# Altium footprint library MOLEX THD.PcbLib: 71 footprints (part 3 of 5) (continued)
## MOLEX_43045-1200 [mm] "3.00mm (.118\") Pitch Micro-Fit 3.0™, Dual Row Righ Angled Header, with PCB Polarizing Peg, 12 Circuits"
height 8.77
pads (14):
  round 1.7 hole 1: 1(7.5,-1.5) 2(4.5,-1.5) 3(1.5,-1.5) 4(-1.5,-1.5) 5(-4.5,-1.5) 6(-7.5,-1.5) 7(7.5,1.5) 8(4.5,1.5) 9(1.5,1.5) 10(-1.5,1.5) 11(-4.5,1.5) 12(-7.5,1.5)
  round 0.5 hole 3 unplated mask+1.25: MECH1(-5.35,-5.82) MECH2(5.35,-5.82)
Top Overlay:
  lines w0.2: -9.325,-0.51 -9.325,-2.26 -8.555,-2.26 ; -8.343,-0.51 -11.075,-0.51 -11.075,-2.11 -10.825,-2.11 -10.825,-9.02 -9.425,-10.42 9.425,-10.42 10.825,-9.02 10.825,-2.11 11.075,-2.11 11.075,-0.51 8.343,-0.51 ; -6.657,-0.51 -5.343,-0.51 ; -6.445,-2.26 -5.555,-2.26 ; -3.657,-0.51 -2.343,-0.51 ; -3.445,-2.26 -2.555,-2.26 ; -0.75,-8.67 0.75,-8.67 ; -0.75,-7.92 0.75,-7.92 ; -0.657,-0.51 0.657,-0.51 ; -0.445,-2.26 0.445,-2.26 ; 2.343,-0.51 3.657,-0.51 ; 2.555,-2.26 3.445,-2.26 ; 5.343,-0.51 6.657,-0.51 ; 5.555,-2.26 6.445,-2.26 ; 8.555,-2.26 9.325,-2.26 9.325,-0.51 ; -0.75,-10.07 0.75,-10.07 0.75,-7.42 -0.75,-7.42 -0.75,-10.07
  text "1" at 7.292,-3.828 h1
  text "7" at 8.942,1.022 h1
  text "12" at -10.358,1.022 h1
  text "6" at -7.708,-3.828 h1
Mechanical 8:
  circle w0.1: c-5.35,-5.82 r1.5
  circle w0.1: c5.35,-5.82 r1.5
  lines w0.1: -8,-1.5 -7.5,-1.5 ; -8,1.5 -7.5,1.5 ; -7.5,-2 -7.5,-1.5 ; -7.5,-1 -7.5,-1.5 ; -7.5,1 -7.5,1.5 ; -7.5,2 -7.5,1.5 ; -7,-1.5 -7.5,-1.5 ; -7,1.5 -7.5,1.5 ; -5.85,-5.82 -5.35,-5.82 ; -5.35,-6.32 -5.35,-5.82 ; -5.35,-5.32 -5.35,-5.82 ; -5,-1.5 -4.5,-1.5 ; -5,1.5 -4.5,1.5 ; -4.85,-5.82 -5.35,-5.82 ; -4.5,-2 -4.5,-1.5 ; -4.5,-1 -4.5,-1.5 ; -4.5,1 -4.5,1.5 ; -4.5,2 -4.5,1.5 ; -4,-1.5 -4.5,-1.5 ; -4,1.5 -4.5,1.5 ; -2,-1.5 -1.5,-1.5 ; -2,1.5 -1.5,1.5 ; -1.5,-2 -1.5,-1.5 ; -1.5,-1 -1.5,-1.5 ; -1.5,1 -1.5,1.5 ; -1.5,2 -1.5,1.5 ; -1,-1.5 -1.5,-1.5 ; -1,1.5 -1.5,1.5 ; -0.5,0 0,0 ; 0,-0.5 0,0 ; 0,0.5 0,0 ; 0.5,0 0,0 ; 1,-1.5 1.5,-1.5 ; 1,1.5 1.5,1.5 ; 1.5,-2 1.5,-1.5 ; 1.5,-1 1.5,-1.5 ; 1.5,1 1.5,1.5 ; 1.5,2 1.5,1.5 ; 2,-1.5 1.5,-1.5 ; 2,1.5 1.5,1.5 ; 4,-1.5 4.5,-1.5 ; 4,1.5 4.5,1.5 ; 4.5,-2 4.5,-1.5 ; 4.5,-1 4.5,-1.5 ; 4.5,1 4.5,1.5 ; 4.5,2 4.5,1.5 ; 4.85,-5.82 5.35,-5.82 ; 5,-1.5 4.5,-1.5 ; 5,1.5 4.5,1.5 ; 5.35,-6.32 5.35,-5.82 ; 5.35,-5.32 5.35,-5.82 ; 5.85,-5.82 5.35,-5.82 ; 7,-1.5 7.5,-1.5 ; 7,1.5 7.5,1.5 ; 7.5,-2 7.5,-1.5 ; 7.5,-1 7.5,-1.5 ; 7.5,1 7.5,1.5 ; 7.5,2 7.5,1.5 ; 8,-1.5 7.5,-1.5 ; 8,1.5 7.5,1.5
Mechanical 14:
  lines w0.1: -9.325,-0.51 -9.325,-2.26 9.325,-2.26 9.325,-0.51 ; -7.82,-0.51 -11.075,-0.51 -11.075,-2.11 -10.825,-2.11 -10.825,-9.02 -9.425,-10.42 9.425,-10.42 10.825,-9.02 10.825,-2.11 11.075,-2.11 11.075,-0.51 7.82,-0.51 ; -7.18,-0.51 -4.82,-0.51 ; -4.18,-0.51 -1.82,-0.51 ; -1.18,-0.51 1.18,-0.51 ; -0.75,-8.67 0.75,-8.67 ; -0.75,-7.92 0.75,-7.92 ; 1.82,-0.51 4.18,-0.51 ; 4.82,-0.51 7.18,-0.51 ; -7.82,-1.82 -7.82,1.82 -7.18,1.82 -7.18,-1.82 -7.82,-1.82 ; -4.82,-1.82 -4.82,1.82 -4.18,1.82 -4.18,-1.82 -4.82,-1.82 ; -1.82,-1.82 -1.82,1.82 -1.18,1.82 -1.18,-1.82 -1.82,-1.82 ; -0.75,-10.07 0.75,-10.07 0.75,-7.42 -0.75,-7.42 -0.75,-10.07 ; 1.18,-1.82 1.18,1.82 1.82,1.82 1.82,-1.82 1.18,-1.82 ; 4.18,-1.82 4.18,1.82 4.82,1.82 4.82,-1.82 4.18,-1.82 ; 7.18,-1.82 7.18,1.82 7.82,1.82 7.82,-1.82 7.18,-1.82
  text "1" at 7.292,-3.828 h1
  text "7" at 8.942,1.022 h1
  text "12" at -10.358,1.022 h1
  text "6" at -7.708,-3.828 h1
3D body "MOLEX_43045-1200.stp": height 8.77, standoff -3.18, extent -11.075,-10.42 11.075,1.82

## MOLEX_43045-2012 [mm] "3.00mm (.118\") Pitch Micro-Fit 3.0™ Header, Dual Row, Vertical, with PCB Polarizing Peg, 20 Circuits"
height 9.91
pads (22):
  round 1.8 hole 1.1: 1(13.5,-1.5) 2(10.5,-1.5) 3(7.5,-1.5) 4(4.5,-1.5) 5(1.5,-1.5) 6(-1.5,-1.5) 7(-4.5,-1.5) 8(-7.5,-1.5) 9(-10.5,-1.5) 10(-13.5,-1.5) 11(13.5,1.5) 12(10.5,1.5) 13(7.5,1.5) 14(4.5,1.5) 15(1.5,1.5) 16(-1.5,1.5) 17(-4.5,1.5) 18(-7.5,1.5) 19(-10.5,1.5) 20(-13.5,1.5)
  round 0.5 hole 1.1 unplated mask+0.3: P1(-16.5,2.44) P2(16.5,2.44)
Top Overlay:
  lines w0.2: -17.075,1.748 -17.075,-3.97 -15.875,-3.97 -15.875,-3.46 ; -17.075,3.132 -17.075,3.4 17.075,3.4 17.075,3.132 ; -16.825,-3.97 -16.825,1.601 ; -16.825,-2.96 -15.875,-3.46 ; -16.825,-2.53 -15.425,-2.53 -15.425,-1.405 -16.825,-1.405 ; -16.825,-0.875 -15.425,-0.875 ; -16.825,0.875 -15.425,0.875 ; -16.825,1.345 -15.425,1.345 ; -16.825,3.279 -16.825,3.4 ; -15.825,-0.875 -15.825,-0.4 -16.125,-0.4 -16.125,0.4 -15.825,0.4 -15.825,0.875 ; -15.6,2.47 -15.425,2.47 ; -15.425,-3.46 -15.425,3.4 ; -1.15,-3.46 -1.15,-3.97 -0.35,-3.97 -0.35,-3.46 ; -0.75,3.4 -0.75,4.8 0.75,4.8 0.75,3.4 ; 0.35,-3.46 0.35,-3.97 1.15,-3.97 1.15,-3.46 ; 15.425,-3.46 15.425,3.4 ; 15.425,-2.53 16.825,-2.53 ; 15.425,-1.405 16.825,-1.405 ; 15.425,-0.875 16.825,-0.875 ; 15.425,0.875 16.825,0.875 ; 15.425,1.345 16.825,1.345 ; 15.425,2.47 15.6,2.47 ; 15.825,-0.875 15.825,-0.4 16.125,-0.4 16.125,0.4 15.825,0.4 15.825,0.875 ; 16.825,-3.97 16.825,1.601 ; 16.825,-2.96 15.875,-3.46 ; 16.825,3.279 16.825,3.4 ; 17.075,1.748 17.075,-3.97 15.875,-3.97 15.875,-3.46 ; -15.875,-3.46 15.875,-3.46 ; -14.77,-2.1 -14.07,-2.8 -12.23,-2.8 -12.23,-0.26 -14.77,-0.26 -14.77,-2.1 ; -14.77,0.9 -14.07,0.2 -12.23,0.2 -12.23,2.74 -14.77,2.74 -14.77,0.9 ; -11.77,-2.1 -11.07,-2.8 -9.23,-2.8 -9.23,-0.26 -11.77,-0.26 -11.77,-2.1 ; -11.77,0.2 -9.93,0.2 -9.23,0.9 -9.23,2.74 -11.77,2.74 -11.77,0.2 ; -8.77,-2.1 -8.07,-2.8 -6.23,-2.8 -6.23,-0.26 -8.77,-0.26 -8.77,-2.1 ; -8.77,0.2 -6.93,0.2 -6.23,0.9 -6.23,2.74 -8.77,2.74 -8.77,0.2 ; -5.77,-2.8 -3.93,-2.8 -3.23,-2.1 -3.23,-0.26 -5.77,-0.26 -5.77,-2.8 ; -5.77,0.2 -3.93,0.2 -3.23,0.9 -3.23,2.74 -5.77,2.74 -5.77,0.2 ; -2.77,-2.8 -0.93,-2.8 -0.23,-2.1 -0.23,-0.26 -2.77,-0.26 -2.77,-2.8 ; -2.77,0.9 -2.07,0.2 -0.23,0.2 -0.23,2.74 -2.77,2.74 -2.77,0.9 ; 0.23,-2.1 0.93,-2.8 2.77,-2.8 2.77,-0.26 0.23,-0.26 0.23,-2.1 ; 0.23,0.9 0.93,0.2 2.77,0.2 2.77,2.74 0.23,2.74 0.23,0.9 ; 3.23,-2.1 3.93,-2.8 5.77,-2.8 5.77,-0.26 3.23,-0.26 3.23,-2.1 ; 3.23,0.2 5.07,0.2 5.77,0.9 5.77,2.74 3.23,2.74 3.23,0.2 ; 6.23,-2.8 8.07,-2.8 8.77,-2.1 8.77,-0.26 6.23,-0.26 6.23,-2.8 ; 6.23,0.2 8.07,0.2 8.77,0.9 8.77,2.74 6.23,2.74 6.23,0.2 ; 9.23,-2.1 9.93,-2.8 11.77,-2.8 11.77,-0.26 9.23,-0.26 9.23,-2.1 ; 9.23,0.9 9.93,0.2 11.77,0.2 11.77,2.74 9.23,2.74 9.23,0.9 ; 12.23,-2.8 14.77,-2.8 14.77,-0.26 12.23,-0.26 12.23,-2.8 ; 12.23,0.9 12.93,0.2 14.77,0.2 14.77,2.74 12.23,2.74 12.23,0.9
  text "20" at -14.231,3.81 h1
  text "1" at 13.342,-4.953 h1
  text "2" at 10.167,-4.953 h1
Mechanical 8:
  circle w0.05: c-13.5,1.5 r0.55
  circle w0.05: c16.5,2.44 r0.55
  circle w0.05: c16.5,2.44 r0.9
  circle w0.05: c-16.5,2.44 r0.55
  circle w0.05: c-16.5,2.44 r0.9
  circle w0.05: c-13.5,1.5 r0.9
  lines w0.05: -16.5,1.94 -16.5,2.44 -16,2.44 ; -14,1.5 -13.5,1.5 ; -13.5,-2 -13.5,-1.5 -13,-1.5 ; -13.5,1 -13.5,1.5 ; -13.5,2 -13.5,1.5 ; -13,1.5 -13.5,1.5 ; -10.5,-2 -10.5,-1.5 -10,-1.5 ; -10.5,1 -10.5,1.5 -10,1.5 ; -7.5,-2 -7.5,-1.5 -7,-1.5 ; -7.5,1 -7.5,1.5 -7,1.5 ; -4.5,-2 -4.5,-1.5 -4,-1.5 ; -4.5,1 -4.5,1.5 -4,1.5 ; -1.5,-2 -1.5,-1.5 -1,-1.5 ; -1.5,1 -1.5,1.5 -1,1.5 ; -0.5,0 0,0 ; 0,-0.5 0,0 ; 0,0.5 0,0 ; 0.5,0 0,0 ; 1.5,-2 1.5,-1.5 2,-1.5 ; 1.5,1 1.5,1.5 2,1.5 ; 4.5,-2 4.5,-1.5 5,-1.5 ; 4.5,1 4.5,1.5 5,1.5 ; 7.5,-2 7.5,-1.5 8,-1.5 ; 7.5,1 7.5,1.5 8,1.5 ; 10.5,-2 10.5,-1.5 11,-1.5 ; 10.5,1 10.5,1.5 11,1.5 ; 13.5,-2 13.5,-1.5 14,-1.5 ; 13.5,1 13.5,1.5 14,1.5 ; 16.5,1.94 16.5,2.44 17,2.44
Mechanical 14:
  lines w0.1: -16.825,-3.97 -16.825,3.4 ; -16.825,-2.96 -15.875,-3.46 ; -16.825,-2.53 -15.425,-2.53 -15.425,-1.405 -16.825,-1.405 ; -16.825,-0.875 -15.425,-0.875 ; -16.825,0.875 -15.425,0.875 ; -16.825,1.345 -15.425,1.345 ; -16.825,2.47 -15.425,2.47 ; -15.825,-0.875 -15.825,-0.4 -16.125,-0.4 -16.125,0.4 -15.825,0.4 -15.825,0.875 ; -15.425,-3.46 -15.425,3.4 ; -1.15,-3.46 -1.15,-3.97 -0.35,-3.97 -0.35,-3.46 ; -0.75,3.4 -0.75,4.8 0.75,4.8 0.75,3.4 ; 0.35,-3.46 0.35,-3.97 1.15,-3.97 1.15,-3.46 ; 15.425,-3.46 15.425,3.4 ; 15.425,-2.53 16.825,-2.53 ; 15.425,-1.405 16.825,-1.405 ; 15.425,-0.875 16.825,-0.875 ; 15.425,0.875 16.825,0.875 ; 15.425,1.345 16.825,1.345 ; 15.425,2.47 16.825,2.47 ; 15.825,-0.875 15.825,-0.4 16.125,-0.4 16.125,0.4 15.825,0.4 15.825,0.875 ; 16.825,-3.97 16.825,3.4 ; 16.825,-2.96 15.875,-3.46 ; -15.875,-3.46 15.875,-3.46 ; -15.875,-3.46 -15.875,-3.97 -17.075,-3.97 -17.075,3.4 17.075,3.4 17.075,-3.97 15.875,-3.97 15.875,-3.46 ; -14.77,-2.1 -14.07,-2.8 -12.23,-2.8 -12.23,-0.26 -14.77,-0.26 -14.77,-2.1 ; -14.77,0.9 -14.07,0.2 -12.23,0.2 -12.23,2.74 -14.77,2.74 -14.77,0.9 ; -11.77,-2.1 -11.07,-2.8 -9.23,-2.8 -9.23,-0.26 -11.77,-0.26 -11.77,-2.1 ; -11.77,0.2 -9.93,0.2 -9.23,0.9 -9.23,2.74 -11.77,2.74 -11.77,0.2 ; -8.77,-2.1 -8.07,-2.8 -6.23,-2.8 -6.23,-0.26 -8.77,-0.26 -8.77,-2.1 ; -8.77,0.2 -6.93,0.2 -6.23,0.9 -6.23,2.74 -8.77,2.74 -8.77,0.2 ; -5.77,-2.8 -3.93,-2.8 -3.23,-2.1 -3.23,-0.26 -5.77,-0.26 -5.77,-2.8 ; -5.77,0.2 -3.93,0.2 -3.23,0.9 -3.23,2.74 -5.77,2.74 -5.77,0.2 ; -2.77,-2.8 -0.93,-2.8 -0.23,-2.1 -0.23,-0.26 -2.77,-0.26 -2.77,-2.8 ; -2.77,0.9 -2.07,0.2 -0.23,0.2 -0.23,2.74 -2.77,2.74 -2.77,0.9 ; 0.23,-2.1 0.93,-2.8 2.77,-2.8 2.77,-0.26 0.23,-0.26 0.23,-2.1 ; 0.23,0.9 0.93,0.2 2.77,0.2 2.77,2.74 0.23,2.74 0.23,0.9 ; 3.23,-2.1 3.93,-2.8 5.77,-2.8 5.77,-0.26 3.23,-0.26 3.23,-2.1 ; 3.23,0.2 5.07,0.2 5.77,0.9 5.77,2.74 3.23,2.74 3.23,0.2 ; 6.23,-2.8 8.07,-2.8 8.77,-2.1 8.77,-0.26 6.23,-0.26 6.23,-2.8 ; 6.23,0.2 8.07,0.2 8.77,0.9 8.77,2.74 6.23,2.74 6.23,0.2 ; 9.23,-2.1 9.93,-2.8 11.77,-2.8 11.77,-0.26 9.23,-0.26 9.23,-2.1 ; 9.23,0.9 9.93,0.2 11.77,0.2 11.77,2.74 9.23,2.74 9.23,0.9 ; 12.23,-2.8 14.77,-2.8 14.77,-0.26 12.23,-0.26 12.23,-2.8 ; 12.23,0.9 12.93,0.2 14.77,0.2 14.77,2.74 12.23,2.74 12.23,0.9
  text "1" at 13.342,-4.953 h1
  text "20" at -14.231,3.81 h1
  text "2" at 10.167,-4.953 h1
3D body "MOLEX_43045-2012.stp": height 9.91, standoff -3.18, extent -17.075,-3.97 17.075,4.8

## MOLEX_43160-2104 [mm] "7.50mm Pitch  4 Circuits Sabre™ Vertical Header  (Glow Wire Compatible) with Board Lock"
height 14.86
pads (10):
  round 2.5 hole 1.8: 1(-11.24,-1.59) 1(-11.24,1.59) 2(-3.747,-1.59) 2(-3.747,1.59) 3(3.747,-1.59) 3(3.747,1.59) 4(11.24,-1.59) 4(11.24,1.59)
  round 3.7 hole 3: MECH1(-15.989,1.844) MECH2(15.989,1.844)
Top Overlay:
  lines w0.2: -18.021,0.879 -18.021,-3.569 -16.751,-5.22 16.777,-5.22 18.047,-3.95 18.047,0.933 ; -18.021,2.808 -18.021,6.312 18.047,6.312 18.047,2.755 ; -16.485,-5.22 -16.485,-3.95 -15.469,-3.95 -15.469,-5.22 ; -16.485,-0.351 -16.485,-1.308 -15.481,-1.308 -15.481,-0.348 ; -16.485,6.312 -16.485,4.28 -15.469,4.28 -15.469,6.312 ; -14.542,0.121 -14.542,-1.105 -12.891,-2.756 -12.407,-2.756 ; -14.542,3.567 -14.542,3.848 -7.938,3.848 -7.938,-1.105 -9.589,-2.756 -10.072,-2.756 ; -5.702,6.312 -5.437,8.166 5.462,8.166 5.728,6.312 ; -4.914,-2.756 -5.398,-2.756 -7.049,-1.105 -7.049,2.197 -5.398,3.848 -2.095,3.848 -0.445,2.197 -0.445,-1.105 -2.095,-2.756 -2.579,-2.756 ; 2.579,-2.756 2.095,-2.756 0.445,-1.105 0.445,2.197 2.095,3.848 5.398,3.848 7.049,2.197 7.049,-1.105 5.398,-2.756 4.914,-2.756 ; 10.072,-2.756 9.589,-2.756 7.938,-1.105 7.938,3.848 14.542,3.848 14.542,3.566 ; 12.407,-2.756 12.891,-2.756 14.542,-1.105 14.542,0.122 ; 15.494,-5.22 15.494,-3.95 16.51,-3.95 16.51,-5.22 ; 15.494,-0.351 15.494,-1.308 16.51,-1.308 16.51,-0.345 ; 15.494,6.312 15.494,4.28 16.51,4.28 16.51,6.312
  text "1" at -11.5,-4.7 h1.2
Mechanical 8:
  lines w0.1: -16.489,1.844 -15.989,1.844 ; -15.989,1.344 -15.989,1.844 ; -15.989,2.344 -15.989,1.844 ; -15.489,1.844 -15.989,1.844 ; -11.74,-1.59 -11.24,-1.59 ; -11.74,1.59 -11.24,1.59 ; -11.24,-2.09 -11.24,-1.59 ; -11.24,-1.09 -11.24,-1.59 ; -11.24,1.09 -11.24,1.59 ; -11.24,2.09 -11.24,1.59 ; -10.74,-1.59 -11.24,-1.59 ; -10.74,1.59 -11.24,1.59 ; -4.247,-1.59 -3.747,-1.59 ; -4.247,1.59 -3.747,1.59 ; -3.747,-2.09 -3.747,-1.59 ; -3.747,-1.09 -3.747,-1.59 ; -3.747,1.09 -3.747,1.59 ; -3.747,2.09 -3.747,1.59 ; -3.247,-1.59 -3.747,-1.59 ; -3.247,1.59 -3.747,1.59 ; -0.5,0 0,0 ; 0,-0.5 0,0 ; 0,0.5 0,0 ; 0.5,0 0,0 ; 3.247,-1.59 3.747,-1.59 ; 3.247,1.59 3.747,1.59 ; 3.747,-2.09 3.747,-1.59 ; 3.747,-1.09 3.747,-1.59 ; 3.747,1.09 3.747,1.59 ; 3.747,2.09 3.747,1.59 ; 4.247,-1.59 3.747,-1.59 ; 4.247,1.59 3.747,1.59 ; 10.74,-1.59 11.24,-1.59 ; 10.74,1.59 11.24,1.59 ; 11.24,-2.09 11.24,-1.59 ; 11.24,-1.09 11.24,-1.59 ; 11.24,1.09 11.24,1.59 ; 11.24,2.09 11.24,1.59 ; 11.74,-1.59 11.24,-1.59 ; 11.74,1.59 11.24,1.59 ; 15.489,1.844 15.989,1.844 ; 15.989,1.344 15.989,1.844 ; 15.989,2.344 15.989,1.844 ; 16.489,1.844 15.989,1.844
Mechanical 14:
  lines w0.1: -16.485,-5.22 -16.485,-3.95 -15.469,-3.95 -15.469,-5.22 ; -16.485,6.312 -16.485,4.28 -15.469,4.28 -15.469,6.312 ; -5.702,6.312 -5.437,8.166 5.462,8.166 5.728,6.312 ; 15.494,-5.22 15.494,-3.95 16.51,-3.95 16.51,-5.22 ; 15.494,6.312 15.494,4.28 16.51,4.28 16.51,6.312 ; -18.021,-3.569 -18.021,6.312 18.047,6.312 18.047,-3.95 16.777,-5.22 -16.751,-5.22 -18.021,-3.569 ; -16.485,-1.308 -16.485,1.232 -15.481,1.232 -15.481,-1.308 -16.485,-1.308 ; -14.542,-1.105 -14.542,3.848 -7.938,3.848 -7.938,-1.105 -9.589,-2.756 -12.891,-2.756 -14.542,-1.105 ; -11.494,-1.041 -11.494,2.134 -10.986,2.134 -10.986,-1.041 -11.494,-1.041 ; -7.049,-1.105 -7.049,2.197 -5.398,3.848 -2.095,3.848 -0.445,2.197 -0.445,-1.105 -2.095,-2.756 -5.398,-2.756 -7.049,-1.105 ; -4.001,-1.041 -4.001,2.134 -3.493,2.134 -3.493,-1.041 -4.001,-1.041 ; 0.445,-1.105 0.445,2.197 2.095,3.848 5.398,3.848 7.049,2.197 7.049,-1.105 5.398,-2.756 2.095,-2.756 0.445,-1.105 ; 3.493,-1.041 3.493,2.134 4.001,2.134 4.001,-1.041 3.493,-1.041 ; 7.938,-1.105 7.938,3.848 14.542,3.848 14.542,-1.105 12.891,-2.756 9.589,-2.756 7.938,-1.105 ; 10.986,-1.041 10.986,2.134 11.494,2.134 11.494,-1.041 10.986,-1.041 ; 15.494,-1.308 15.494,1.232 16.51,1.232 16.51,-1.308 15.494,-1.308
  text "1" at -11.5,-4.7 h1.2
3D body "MOLEX_43160-2104.stp": height 14.76, standoff -3.81, extent -18.021,-5.22 18.047,8.166

## MOLEX_43879-0022 [mm] "4.20mm Pitch, Mini-Fit® CPI (Compliant Pin Interface) 4 Circuits Dual Row Vertical Header"
height 14.9
pads (4):
  round 2.5 hole 1.8: 1(-2.1,1.9) 2(2.1,1.9) 3(-2.1,-2.314) 4(2.1,-2.314)
Top Overlay:
  lines w0.2: -9.405,-1.8 -8.525,-1.8 ; -9.405,-1.3 -8.525,-1.3 ; -9.405,1.25 -7.5,1.25 ; -9.405,2.75 -7.5,2.75 ; -8.833,4.5 -8.6,4.001 ; -8.525,1.25 -8.525,2.75 ; -8.075,-1.8 -6.755,-1.8 -6.755,-1.3 ; -8.075,-1.3 -4.3,-1.3 ; -8.075,1.25 -8.075,2.75 ; -7.767,4.5 -8,4.001 ; -7.5,-4.3 -7.5,-7.5 -3,-7.5 -3,-4 ; -7.5,-1.3 -7.5,7.5 7.5,7.5 7.5,-1.3 ; -7.5,4.5 -9.405,4.5 -9.405,-4.3 -3,-4.3 ; -6.86,-4.3 -6.86,-1.8 ; -6.6,-4.3 -6.6,-6.6 ; -6.6,-1.3 -6.6,6.6 ; -3,-6.6 -6.6,-6.6 ; -3,-6.55 -2,-6.55 -2,-4 ; -3,-5.35 -2,-5.35 ; -2.845,0.4 -4,0.4 -4,4 -0.2,4 -0.2,0.4 -1.355,0.4 ; -2,-6.4 2,-6.4 ; 1.355,0.4 0.2,0.4 0.2,3.2 1,4 3.2,4 4,3.2 4,0.4 2.845,0.4 ; 2,-5.35 3,-5.35 ; 2,-3.986 2,-6.55 3,-6.55 ; 3,-6.6 6.6,-6.6 ; 3,-4.3 9.405,-4.3 9.405,4.5 7.5,4.5 ; 3,-4 3,-7.5 7.5,-7.5 7.5,-4.3 ; 4.3,-1.3 8.075,-1.3 ; 6.6,-4.3 6.6,-6.6 ; 6.6,-1.3 6.6,6.6 ; 6.86,-4.3 6.86,-1.8 ; 7.5,1.25 9.405,1.25 ; 7.5,2.75 9.405,2.75 ; 7.767,4.5 8,4.001 ; 8.075,1.25 8.075,2.75 ; 8.525,-1.3 9.405,-1.3 ; 8.525,1.25 8.525,2.75 ; 8.833,4.5 8.6,4 ; -8.6,4.001 -8,4.001 ; -8.6,4.001 -8.6,3.75 -8,3.75 -8,4.001 ; -6.6,-6.6 -4.3,-4.3 -4.3,4.3 ; -6.6,6.6 -4.3,4.3 ; -6.6,6.6 6.6,6.6 ; -4.3,4.3 4.3,4.3 ; 4.3,4.3 6.6,6.6 ; 4.3,4.3 4.3,-4.3 6.6,-6.6 ; 8,4.001 8.6,4 ; 8,4.001 8,3.75 8.6,3.75 8.6,4.001 ; -8.525,-2.3 -8.075,-2.3 -8.075,-0.8 -8.525,-0.8 -8.525,-2.3 ; -4,-4 -4,-1.2 -3.2,-0.4 -1,-0.4 -0.2,-1.2 -0.2,-4 -4,-4 ; 0.2,-4 4,-4 4,-0.4 0.2,-0.4 0.2,-4 ; 8.075,-2.3 8.525,-2.3 8.525,-0.8 8.075,-0.8 8.075,-2.3
  text "1" at -5.767,1.432 h1
  text "4" at 5.242,-2.975 h1
  text "2" at 5.192,1.386 h1
  text "3" at -5.733,-3.289 h1
Mechanical 8:
  lines w0.1: -2.6,-2.314 -2.1,-2.314 ; -2.6,1.9 -2.1,1.9 ; -2.1,-2.814 -2.1,-2.314 ; -2.1,-1.814 -2.1,-2.314 ; -2.1,1.4 -2.1,1.9 ; -2.1,2.4 -2.1,1.9 ; -1.6,-2.314 -2.1,-2.314 ; -1.6,1.9 -2.1,1.9 ; -0.5,0 0,0 ; 0,-0.5 0,0 ; 0,0.5 0,0 ; 0.5,0 0,0 ; 1.6,-2.314 2.1,-2.314 ; 1.6,1.9 2.1,1.9 ; 2.1,-2.814 2.1,-2.314 ; 2.1,-1.814 2.1,-2.314 ; 2.1,1.4 2.1,1.9 ; 2.1,2.4 2.1,1.9 ; 2.6,-2.314 2.1,-2.314 ; 2.6,1.9 2.1,1.9
Mechanical 14:
  lines w0.1: -9.405,-1.8 -8.525,-1.8 ; -9.405,-1.3 -8.525,-1.3 ; -9.405,1.25 -7.5,1.25 ; -9.405,2.75 -7.5,2.75 ; -8.833,4.5 -8.6,4.001 ; -8.525,1.25 -8.525,2.75 ; -8.075,-1.8 -6.755,-1.8 -6.755,-1.3 ; -8.075,-1.3 -4.3,-1.3 ; -8.075,1.25 -8.075,2.75 ; -7.767,4.5 -8,4.001 ; -7.5,-4.3 -7.5,-7.5 -3,-7.5 -3,-3.55 -2,-3.55 -2,-6.55 -3,-6.55 ; -7.5,-1.3 -7.5,7.5 7.5,7.5 7.5,-1.3 ; -7.5,4.5 -9.405,4.5 -9.405,-4.3 -3,-4.3 ; -6.86,-4.3 -6.86,-1.8 ; -6.6,-4.3 -6.6,-6.6 ; -6.6,-1.3 -6.6,6.6 ; -3,-6.6 -6.6,-6.6 ; -3,-5.35 -2,-5.35 ; -2,-6.4 2,-6.4 ; -0.7,-4 -0.7,-2.3 -0.2,-2.3 ; -0.7,-0.7 -0.7,-1.5 -0.2,-1.5 ; -0.7,0.4 -0.7,2.1 -0.2,2.1 ; 0.2,-3.96 0.7,-3.96 0.7,-2.3 0.2,-2.3 ; 0.2,-1.5 0.7,-1.5 0.7,-0.4 ; 0.2,2.1 0.7,2.1 0.7,0.4 ; 2,-5.35 3,-5.35 ; 3,-6.6 6.6,-6.6 ; 3,-6.55 2,-6.55 2,-3.55 3,-3.55 3,-7.5 7.5,-7.5 7.5,-4.3 ; 3,-4.3 9.405,-4.3 9.405,4.5 7.5,4.5 ; 4.3,-1.3 8.075,-1.3 ; 6.6,-4.3 6.6,-6.6 ; 6.6,-1.3 6.6,6.6 ; 6.86,-4.3 6.86,-1.8 ; 7.5,1.25 9.405,1.25 ; 7.5,2.75 9.405,2.75 ; 7.767,4.5 8,4.001 ; 8.075,1.25 8.075,2.75 ; 8.525,-1.3 9.405,-1.3 ; 8.525,1.25 8.525,2.75 ; 8.833,4.5 8.6,4 ; -8.6,4.001 -8,4.001 ; -8.6,4.001 -8.6,3.75 -8,3.75 -8,4.001 ; -6.6,-6.6 -4.3,-4.3 -4.3,4.3 ; -6.6,6.6 -4.3,4.3 ; -6.6,6.6 6.6,6.6 ; -4.3,4.3 4.3,4.3 ; 4.3,4.3 6.6,6.6 ; 4.3,4.3 4.3,-4.3 6.6,-6.6 ; 8,4.001 8.6,4 ; 8,4.001 8,3.75 8.6,3.75 8.6,4.001 ; -8.525,-2.3 -8.075,-2.3 -8.075,-0.8 -8.525,-0.8 -8.525,-2.3 ; -4,-4 -4,-1.2 -3.2,-0.4 -1,-0.4 -0.2,-1.2 -0.2,-4 -4,-4 ; -4,0.4 -0.2,0.4 -0.2,4 -4,4 -4,0.4 ; -2.475,-2.675 -1.725,-2.675 -1.725,-1.925 -2.475,-1.925 -2.475,-2.675 ; -2.475,1.525 -1.725,1.525 -1.725,2.275 -2.475,2.275 -2.475,1.525 ; 0.2,-4 4,-4 4,-0.4 0.2,-0.4 0.2,-4 ; 0.2,0.4 0.2,3.2 1,4 3.2,4 4,3.2 4,0.4 0.2,0.4 ; 1.725,-2.675 2.475,-2.675 2.475,-1.925 1.725,-1.925 1.725,-2.675 ; 1.725,1.525 2.475,1.525 2.475,2.275 1.725,2.275 1.725,1.525 ; 8.075,-2.3 8.525,-2.3 8.525,-0.8 8.075,-0.8 8.075,-2.3
  text "1" at -5.767,1.432 h1
  text "4" at 5.242,-2.975 h1
  text "2" at 5.192,1.386 h1
  text "3" at -5.733,-3.289 h1
Drill Drawing:
  lines w0.1: -4,-4 -4,4 4,4 4,-4 -4,-4
  text "PRESS-FIT TECHNOLOGY" at -8.275,6.075 h1
  text "diam. 1.8mm +0.1 -0.05" at -8.9,4.4 h1
3D body "MOLEX_43879-0022.stp": height 14.9, standoff -5.82, extent -9.405,-7.5 9.405,7.5

## MOLEX_48037-0001 [mm] "Right Angled Through Hole Shielded USB Plug, Type A"
height 4.6
pads (8):
  round 1.25 hole 0.7: 1(3.5,0) 2(1,0) 3(-1,0) 4(-3.5,0)
  round 1.8 hole 1.1: 5(-2.25,-2.1) 6(2.25,-2.1)
  oval 1.35x2.85 hole 1 slot 2.5 at 90 deg: SHIELD(-5.7,-2.1) SHIELD(5.7,-2.1)
Top Overlay:
  lines w0.2: -6,-4.063 -6,-19.727 -5.9,-19.9 5.9,-19.9 6,-19.727 6,-4.063 ; -5.1,-10.45 -4.3,-10.45 -4.3,-9.2 -5.1,-9.2 -5.1,-10.45 ; -4.1,-14.9 -1.9,-14.9 -1.9,-13.1 -4.1,-13.1 -4.1,-14.9 ; 1.9,-14.9 1.9,-13.1 4.1,-13.1 4.1,-14.9 1.9,-14.9 ; 4.3,-10.45 5.1,-10.45 5.1,-9.2 4.3,-9.2 4.3,-10.45
Mechanical 8:
  circle w0.1: c3.5,0 r0.45
  circle w0.1: c1,0 r0.45
  circle w0.1: c-1,0 r0.45
  circle w0.1: c-3.5,0 r0.45
  circle w0.1: c-2.25,-2.1 r0.55
  circle w0.1: c2.25,-2.1 r0.55
  circle w0.1: c-2.25,-2.1 r0.9
  circle w0.1: c2.25,-2.1 r0.9
  circle w0.1: c-3.5,0 r0.8
  circle w0.1: c-1,0 r0.8
  circle w0.1: c1,0 r0.8
  circle w0.1: c3.5,0 r0.8
  lines w0.1: -6.2,-2.1 -5.7,-2.1 ; -5.7,-4.85 0,-4.85 5.7,-4.85 ; -5.7,-2.6 -5.7,-2.1 ; -5.7,-1.6 -5.7,-2.1 ; -5.2,-2.1 -5.7,-2.1 ; -4,0 -3.5,0 ; -3.5,-0.5 -3.5,0 ; -3.5,0.5 -3.5,0 ; -3,0 -3.5,0 ; -2.75,-2.1 -2.25,-2.1 ; -2.25,-2.6 -2.25,-2.1 ; -2.25,-1.6 -2.25,-2.1 ; -1.75,-2.1 -2.25,-2.1 ; -1.5,0 -1,0 ; -1,-0.5 -1,0 ; -1,0.5 -1,0 ; -0.5,0 -1,0 ; -0.354,-0.354 0,0 ; -0.354,0.354 0,0 ; 0.354,-0.354 0,0 ; 0.354,0.354 0,0 ; 0.5,0 1,0 ; 1,-0.5 1,0 ; 1,0.5 1,0 ; 1.5,0 1,0 ; 1.75,-2.1 2.25,-2.1 ; 2.25,-2.6 2.25,-2.1 ; 2.25,-1.6 2.25,-2.1 ; 2.75,-2.1 2.25,-2.1 ; 3,0 3.5,0 ; 3.5,-0.5 3.5,0 ; 3.5,0.5 3.5,0 ; 4,0 3.5,0 ; 5.2,-2.1 5.7,-2.1 ; 5.7,-2.6 5.7,-2.1 ; 5.7,-1.6 5.7,-2.1 ; 6.2,-2.1 5.7,-2.1 ; -6.55,-2.85 ccw(c-5.7,-2.85) -4.85,-2.85 -4.85,-1.35 ccw(c-5.7,-1.35) -6.55,-1.35 -6.55,-2.85 ; -6.2,-2.85 ccw(c-5.7,-2.85) -5.2,-2.85 -5.2,-1.35 ccw(c-5.7,-1.35) -6.2,-1.35 -6.2,-2.85 ; 4.85,-2.85 ccw(c5.7,-2.85) 6.55,-2.85 6.55,-1.35 ccw(c5.7,-1.35) 4.85,-1.35 4.85,-2.85 ; 5.2,-2.85 ccw(c5.7,-2.85) 6.2,-2.85 6.2,-1.35 ccw(c5.7,-1.35) 5.2,-1.35 5.2,-2.85
Mechanical 14:
  lines w0.1: -6,-3.1 -6.349,-3.1 -6.349,-1.1 6.349,-1.1 6.349,-3.1 6,-3.1 ; -6,-1.1 -6,-19.727 -5.9,-19.9 5.9,-19.9 6,-19.727 6,-1.1 ; -3.8,-1.11 -3.8,0.125 -3.2,0.125 -3.2,-1.1 ; -1.3,-1.1 -1.3,0.125 -0.7,0.125 -0.7,-1.1 ; 0.7,-1.1 0.7,0.125 1.3,0.125 1.3,-1.1 ; 3.2,-1.1 3.2,0.125 3.8,0.125 3.8,-1.1 ; -5.1,-10.45 -4.3,-10.45 -4.3,-9.2 -5.1,-9.2 -5.1,-10.45 ; -4.1,-14.9 -1.9,-14.9 -1.9,-13.1 -4.1,-13.1 -4.1,-14.9 ; 1.9,-14.9 1.9,-13.1 4.1,-13.1 4.1,-14.9 1.9,-14.9 ; 4.3,-10.45 5.1,-10.45 5.1,-9.2 4.3,-9.2 4.3,-10.45
3D body "MOLEX_48037-0001.stp": height 3.07, standoff -2.81, extent -6.173,-19.9 6.173,0.125

## MOLEX_52030-0629 [mm] "6 Contacts, 1.0mm Pitch, Vertical Through-Hole FCC/FPC Connector"
height 6.7
pads (6):
  round 1.4 hole 0.7: 1(-2.5,-1) 2(-1.5,1) 3(-0.5,-1) 4(0.5,1) 5(1.5,-1) 6(2.5,1)
Top Overlay:
  circle w0.3: c-2.525,-2.35 r0.15
  lines w0.2: -3.8,1.75 -3.8,-0.2 ; -3.6,1.75 -3.6,0 ; -3.575,1.177 -2.725,1.177 ; -3.305,-1.75 -5.15,-1.75 -5.65,-1.25 -5.65,1.75 -2.305,1.75 ; -3.255,-0.2 -3.8,-0.2 ; -2.958,0 -3.6,0 ; -2.725,0.077 -2.725,0.9 ; -2.725,1.25 -2.571,1.25 ; -1.745,-0.2 -1.255,-0.2 ; -1.695,-1.75 -1.305,-1.75 ; -0.695,1.75 -0.305,1.75 ; 0.255,-0.2 0.745,-0.2 ; 0.305,-1.75 0.695,-1.75 ; 1.305,1.75 1.695,1.75 ; 2.255,-0.2 3.8,-0.2 ; 2.305,-1.75 5.15,-1.75 5.65,-1.25 5.65,1.75 3.305,1.75 ; 2.958,0 3.6,0 ; 3.525,1.4 3.575,1.4 3.575,1.233 ; 3.6,1.75 3.6,0 ; 3.8,1.75 3.8,-0.2 ; -3.8,-0.2 -3.6,0 ; -2.725,0.9 -2.725,1.4 -3.575,1.4 -3.575,0.9 -2.725,0.9 ; 3.6,0 3.8,-0.2
Mechanical 8:
  lines w0.1: -3,-1 -2.5,-1 ; -2.5,-1.5 -2.5,-1 ; -2.5,-0.5 -2.5,-1 ; -2,-1 -2.5,-1 ; -2,1 -1.5,1 ; -1.5,0.5 -1.5,1 ; -1.5,1.5 -1.5,1 ; -1,-1 -0.5,-1 ; -1,1 -1.5,1 ; -0.5,-1.5 -0.5,-1 ; -0.5,-0.5 -0.5,-1 ; -0.5,0 0,0 ; 0,-1 -0.5,-1 ; 0,-0.5 0,0 ; 0,0.5 0,0 ; 0,1 0.5,1 ; 0.5,0 0,0 ; 0.5,0.5 0.5,1 ; 0.5,1.5 0.5,1 ; 1,-1 1.5,-1 ; 1,1 0.5,1 ; 1.5,-1.5 1.5,-1 ; 1.5,-0.5 1.5,-1 ; 2,-1 1.5,-1 ; 2,1 2.5,1 ; 2.5,0.5 2.5,1 ; 2.5,1.5 2.5,1 ; 3,1 2.5,1
Mechanical 14:
  circle w0.3: c-2.525,-2.35 r0.15
  lines w0.1: -3.8,1.75 -3.8,-0.2 ; -3.6,1.75 -3.6,0 ; -3.575,1.177 -2.725,1.177 ; -2.725,0 -2.725,0.9 ; -2.725,1.25 -2.275,1.25 ; -2.275,0 -2.275,0.9 ; -2,1.4 -2,1.061 ; -1.725,0 -1.725,0.9 ; -1.725,1.061 -2,1.061 ; -1.725,1.25 -1.275,1.25 ; -1.275,0 -1.275,0.9 ; -1.275,1.061 -0.725,1.061 ; -0.725,0 -0.725,0.9 ; -0.725,1.25 -0.275,1.25 ; -0.275,0 -0.275,0.9 ; -0.275,1.061 0.275,1.061 ; 0.275,0 0.275,0.9 ; 0.275,1.25 0.725,1.25 ; 0.725,0 0.725,0.9 ; 0.725,1.061 1.275,1.061 ; 1.275,0 1.275,0.9 ; 1.275,1.25 1.725,1.25 ; 1.725,0 1.725,0.9 ; 1.725,1.061 2,1.061 ; 2,1.4 2,1.061 ; 2.275,0 2.275,0.9 ; 2.275,1.25 2.725,1.25 ; 2.725,0 2.725,0.9 ; 2.725,1.177 3.575,1.177 ; 3.6,1.75 3.6,0 ; 3.8,1.75 3.8,-0.2 ; -3.8,-0.2 -3.6,0 ; -3.8,-0.2 3.8,-0.2 ; -3.6,0 3.6,0 ; -2.725,0.9 -2.725,1.4 -3.575,1.4 -3.575,0.9 -2.725,0.9 ; -2.275,0.9 -2,1.061 ; -2.275,0.9 -2.275,1.4 -1.725,1.4 -1.725,0.9 ; -2.275,0.9 -1.725,0.9 ; -1.275,0.9 -1.275,1.4 -0.725,1.4 -0.725,0.9 ; -1.275,0.9 -0.725,0.9 ; -0.275,0.9 -0.275,1.4 0.275,1.4 0.275,0.9 ; -0.275,0.9 0.275,0.9 ; 0.725,0.9 0.725,1.4 1.275,1.4 1.275,0.9 ; 0.725,0.9 1.275,0.9 ; 1.725,0.9 1.725,1.4 2.275,1.4 2.275,0.9 ; 1.725,0.9 2.275,0.9 ; 2,1.061 2.275,0.9 ; 2.725,0.9 2.725,1.4 3.575,1.4 3.575,0.9 2.725,0.9 ; 3.6,0 3.8,-0.2 ; -5.65,-1.25 -5.15,-1.75 5.15,-1.75 5.65,-1.25 5.65,1.75 -5.65,1.75 -5.65,-1.25
3D body "MOLEX_52030-0629.stp": height 6.7, standoff -3.2, extent -5.65,-1.75 5.65,1.75

## MOLEX_53047-0210 [mm] "1.25mm Pitch PicoBlade™ Wire-to-Board 2 Circuits Vertical Header with Friction Lock"
height 4.2
pads (2):
  rrect50% 1.05x1.25 hole 0.55: 1(-0.625,0) 2(0.625,0)
Top Overlay:
  circle w0.3: c-0.625,-1.825 r0.15
  lines w0.2: -2.125,1.675 2.125,1.675 ; -1.825,0.05 -1.525,0.05 -1.525,-0.725 ; -1.825,0.9 -1.525,0.9 -1.525,1.975 1.525,1.975 1.525,0.9 1.825,0.9 ; -1.825,1.675 -1.825,-1.025 ; -1.325,-0.725 -1.525,-0.725 ; -1.325,1.675 -1.325,2.075 ; 1.325,-0.725 1.525,-0.725 ; 1.325,1.675 1.325,2.075 ; 1.825,0.05 1.525,0.05 1.525,-0.725 ; 1.825,1.675 1.825,-1.025 ; -1.825,-1.025 1.825,-1.025 ; -1.825,-1.025 -1.525,-0.725 ; 1.525,-0.725 1.825,-1.025 ; -2.125,-1.125 2.125,-1.125 2.125,2.075 -2.125,2.075 -2.125,-1.125
Mechanical 8:
  lines w0.1: -1.125,0 -0.625,0 ; -0.625,-0.5 -0.625,0 ; -0.625,0.5 -0.625,0 ; -0.354,-0.354 0,0 ; -0.354,0.354 0,0 ; -0.125,0 -0.625,0 ; 0.125,0 0.625,0 ; 0.354,-0.354 0,0 ; 0.354,0.354 0,0 ; 0.625,-0.5 0.625,0 ; 0.625,0.5 0.625,0 ; 1.125,0 0.625,0
Mechanical 14:
  circle w0.3: c-0.625,-1.825 r0.15
  lines w0.1: -2.125,1.675 2.125,1.675 ; -1.825,0.05 -1.525,0.05 -1.525,-0.725 ; -1.825,0.9 -1.525,0.9 -1.525,1.975 1.525,1.975 1.525,0.9 1.825,0.9 ; -1.825,1.675 -1.825,-1.025 ; -1.325,1.675 -1.325,2.075 ; 1.325,1.675 1.325,2.075 ; 1.825,0.05 1.525,0.05 1.525,-0.725 ; 1.825,1.675 1.825,-1.025 ; -1.825,-1.025 1.825,-1.025 ; -1.825,-1.025 -1.525,-0.725 ; -1.525,-0.725 1.525,-0.725 ; -0.785,-0.35 -0.65,-0.225 ; -0.785,-0.35 -0.785,0.35 ; -0.785,-0.35 -0.465,-0.35 ; -0.785,0.35 -0.65,0.225 ; -0.785,0.35 -0.465,0.35 ; -0.65,-0.225 -0.65,0.225 ; -0.65,-0.225 -0.6,-0.225 ; -0.65,0.225 -0.6,0.225 ; -0.6,-0.225 -0.6,0.225 ; -0.6,-0.225 -0.465,-0.35 ; -0.6,0.225 -0.465,0.35 ; -0.465,-0.35 -0.465,0.35 ; 0.465,-0.35 0.6,-0.225 ; 0.465,-0.35 0.465,0.35 ; 0.465,-0.35 0.785,-0.35 ; 0.465,0.35 0.6,0.225 ; 0.465,0.35 0.785,0.35 ; 0.6,-0.225 0.6,0.225 ; 0.6,-0.225 0.65,-0.225 ; 0.6,0.225 0.65,0.225 ; 0.65,-0.225 0.65,0.225 ; 0.65,-0.225 0.785,-0.35 ; 0.65,0.225 0.785,0.35 ; 0.785,-0.35 0.785,0.35 ; 1.525,-0.725 1.825,-1.025 ; -2.125,-1.125 2.125,-1.125 2.125,2.075 -2.125,2.075 -2.125,-1.125
3D body "MOLEX_53047-0210.stp": height 4.2, standoff -2.2, extent -2.125,-1.175 2.125,2.075